# Altium footprint library Capacitance_PcbLib.PcbLib: 22 footprints (part 2 of 2)
Each footprint in its own frame and in the unit in brackets; x right, y up, seen from the top. Pads: shape width x height; smd on the part's side, far side on the other; paste and mask are expansions set on the pad; w line width, h text height; cw(c..) or ccw(c..) is an arc to the next point about the centre after c.
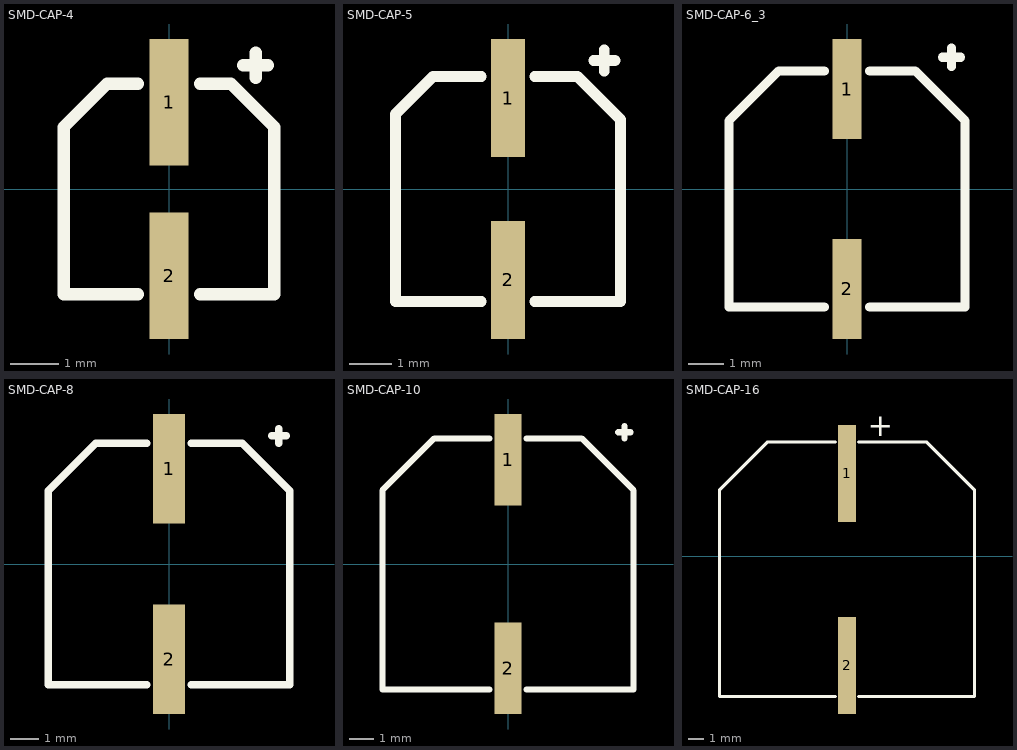
[diagram p1: the footprints below, top view; thin cyan lines are the x and y axes]

## SMD-CAP-4 [mm]
pads (2):
  rect 0.8x2.6 smd: 1(0,1.778) 2(0,-1.778)
Top Overlay:
  lines w0.254: -0.635,-2.159 -2.159,-2.159 -2.159,1.27 -1.27,2.159 -0.635,2.159 ; 0.635,-2.159 2.159,-2.159 2.159,1.27 1.27,2.159 0.635,2.159 ; 1.524,2.54 2.032,2.54 ; 1.778,2.286 1.778,2.794
3D body: height 5.4, standoff 0, extent -2.141,-2.5 2.159,2.5

## SMD-CAP-5 [mm]
pads (2):
  rect 0.8x2.8 smd: 1(0,2.159) 2(0,-2.159)
Top Overlay:
  lines w0.254: -0.635,-2.667 -2.667,-2.667 -2.667,1.778 -1.778,2.667 -0.635,2.667 ; 0.635,-2.667 2.667,-2.667 2.667,1.651 1.651,2.667 0.635,2.667 ; 2.032,3.048 2.54,3.048 ; 2.286,2.794 2.286,3.302
3D body: height 5.9, standoff 0, extent -2.65,-3 2.65,3

## SMD-CAP-6_3 [mm]
pads (2):
  rect 0.8x2.8 smd: 1(0,2.794) 2(0,-2.794)
Top Overlay:
  lines w0.254: -0.635,-3.302 -3.302,-3.302 -3.302,1.905 -1.905,3.302 -0.635,3.302 ; 0.635,-3.302 3.302,-3.302 3.302,1.905 1.905,3.302 0.635,3.302 ; 2.667,3.683 3.175,3.683 ; 2.921,3.429 2.921,3.937
3D body: height 5.9, standoff 0, extent -3.3,-3.65 3.3,3.65

## SMD-CAP-8 [mm]
pads (2):
  rect 1.1x3.8 smd: 1(0,3.302) 2(0,-3.302)
Top Overlay:
  lines w0.254: -0.762,-4.191 -4.191,-4.191 -4.191,2.54 -2.54,4.191 -0.762,4.191 ; 0.762,-4.191 4.191,-4.191 4.191,2.54 2.54,4.191 0.762,4.191 ; 3.556,4.445 4.064,4.445 ; 3.81,4.191 3.81,4.699
3D body: height 6.9, standoff 0, extent -4.15,-4.5 4.15,4.5

## SMD-CAP-10 [mm]
pads (2):
  rect 1.1x3.8 smd: 1(0,4.318) 2(0,-4.318)
Top Overlay:
  lines w0.254: -0.762,-5.207 -5.207,-5.207 -5.207,3.048 -3.048,5.207 -0.762,5.207 ; 0.762,-5.207 5.207,-5.207 5.207,3.048 3.048,5.207 0.762,5.207 ; 4.572,5.461 5.08,5.461 ; 4.826,5.207 4.826,5.715
3D body: height 12.6, standoff 0, extent -5.15,-5.5 5.15,5.5

## SMD-CAP-16 [mm]
pads (2):
  rect 1.2x6.5 smd: 1(-12.7,5.524) 2(-12.7,-7.302)
Top Overlay:
  lines w0.2: -13.462,-9.398 -21.209,-9.398 -21.209,4.445 -18.034,7.62 -13.462,7.62 ; -11.938,-9.398 -4.191,-9.398 -4.191,4.445 -7.366,7.62 -11.938,7.62
  text "+" at -11.303,8.001 h1.5